# Altium footprint library Connectors Pad Lib.PcbLib: 211 footprints (part 1 of 14)
Each footprint in its own frame and in the unit in brackets; x right, y up, seen from the top. Pads: shape width x height; smd on the part's side, far side on the other; paste and mask are expansions set on the pad; w line width, h text height; cw(c..) or ccw(c..) is an arc to the next point about the centre after c.
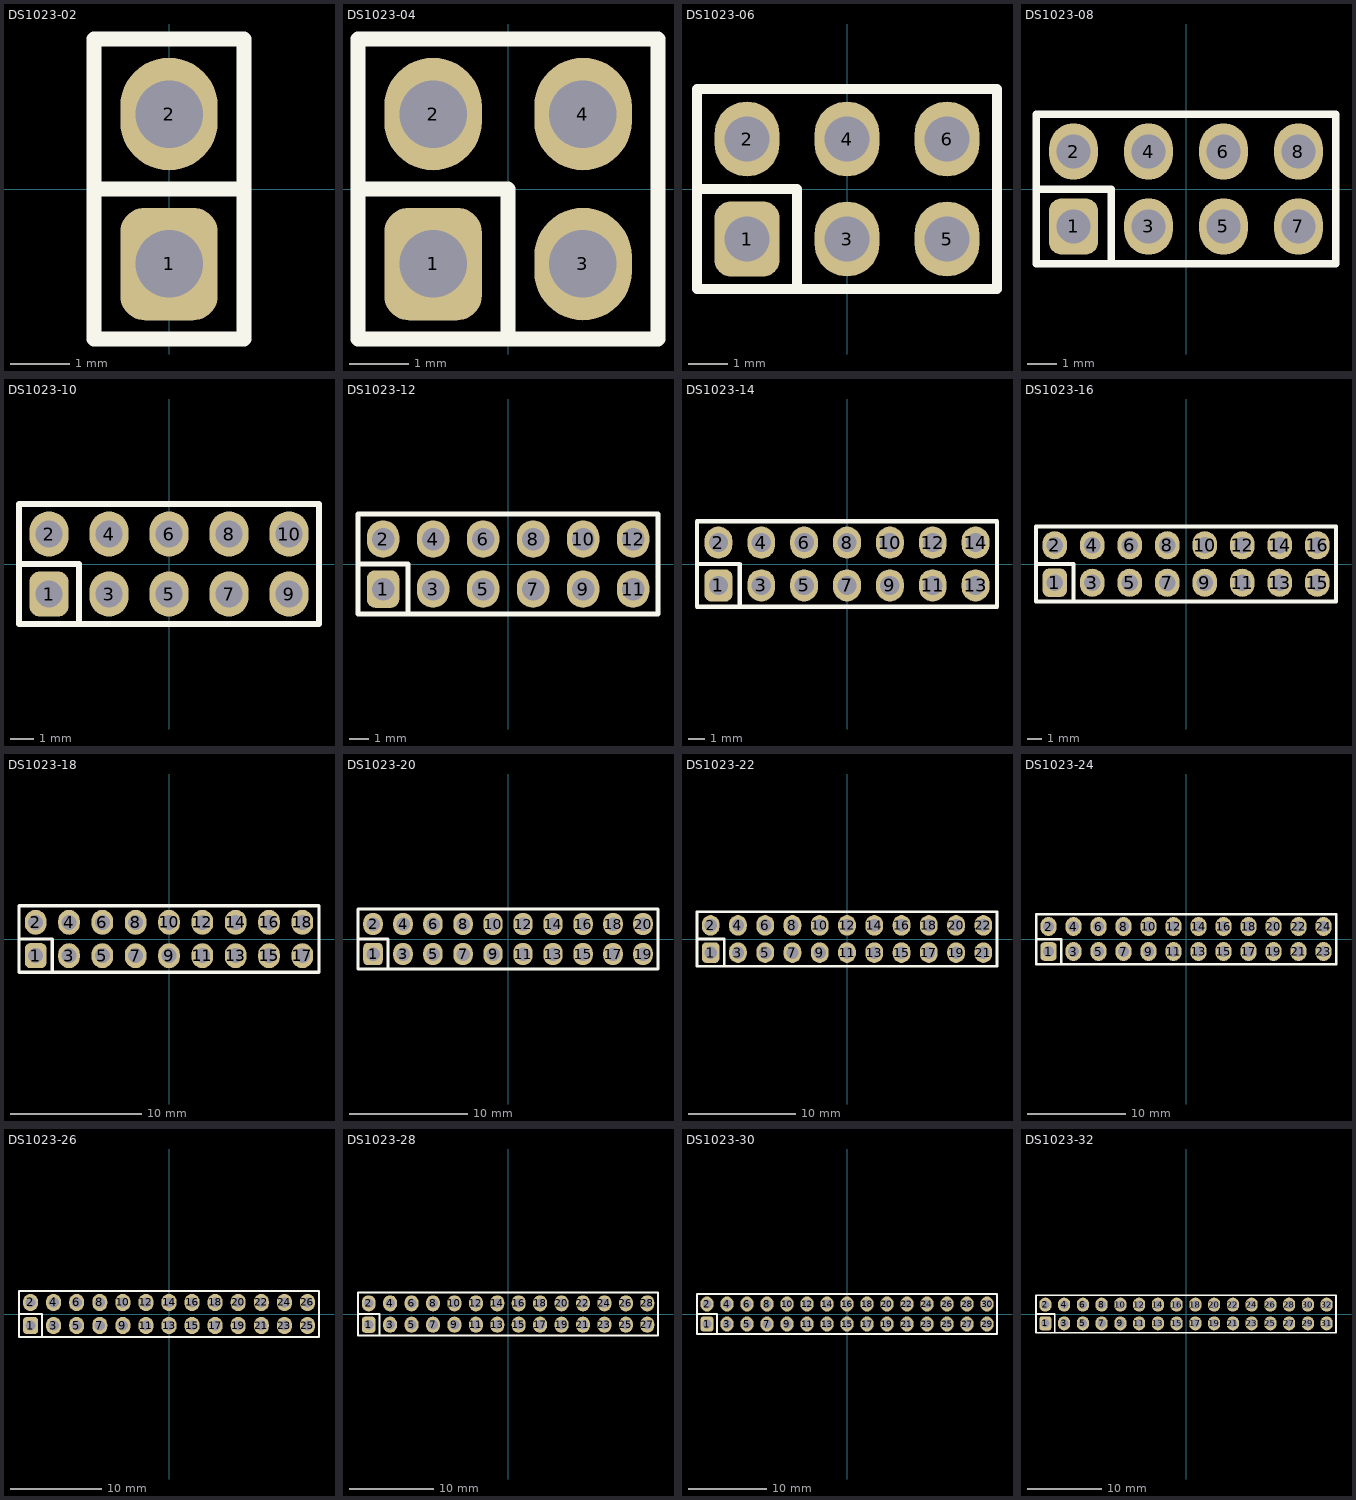
[diagram p0: the footprints below, top view; thin cyan lines are the x and y axes]

## DS1023-02 [mil]
pads (2):
  rrect50% 65x75 hole 45: 1(0,-50)
  oval 65x75 hole 45: 2(0,50)
Top Overlay:
  lines w10: -50,0 50,0 ; -50,-100 -50,100 50,100 50,-100 -50,-100
3D body "DS-1023-02.STEP": height 335.65, standoff -117.11, extent -50,-98.43 50,98.43

## DS1023-04 [mil]
pads (4):
  rrect50% 65x75 hole 45: 1(-50,-50)
  oval 65x75 hole 45: 2(-50,50) 3(50,-50) 4(50,50)
Top Overlay:
  lines w10: -100,0 0,0 0,-100 ; -100,-100 -100,100 100,100 100,-100 -100,-100
3D body "DS-1023-04.STEP": height 335.65, standoff -117.11, extent -100,-98.43 100,98.43

## DS1023-06 [mil]
pads (6):
  rrect50% 65x75 hole 45: 1(-100,-50)
  oval 65x75 hole 45: 2(-100,50) 3(0,-50) 4(0,50) 5(100,-50) 6(100,50)
Top Overlay:
  lines w10: -150,0 -50,0 -50,-100 ; -150,-100 150,-100 150,100 -150,100 -150,-100
3D body "DS-1023-06.STEP": height 335.65, standoff -117.11, extent -150,-98.43 150,98.43

## DS1023-08 [mil]
pads (8):
  rrect50% 65x75 hole 45: 1(-150,-50)
  oval 65x75 hole 45: 2(-150,50) 3(-50,-50) 4(-50,50) 5(50,-50) 6(50,50) 7(150,-50) 8(150,50)
Top Overlay:
  lines w10: -200,0 -100,0 -100,-100 ; -200,-100 200,-100 200,100 -200,100 -200,-100
3D body "DS-1023-08.STEP": height 335.65, standoff -117.11, extent -200,-98.43 200,98.43

## DS1023-10 [mil]
pads (10):
  rrect50% 65x75 hole 45: 1(-200,-50)
  oval 65x75 hole 45: 2(-200,50) 3(-100,-50) 4(-100,50) 5(0,-50) 6(0,50) 7(100,-50) 8(100,50) 9(200,-50) 10(200,50)
Top Overlay:
  lines w10: -250,0 -150,0 -150,-100 ; -250,-100 250,-100 250,100 -250,100 -250,-100
3D body "DS-1023-10.STEP": height 335.65, standoff -117.11, extent -250,-98.43 250,98.43

## DS1023-12 [mil]
pads (12):
  rrect50% 65x75 hole 45: 1(-250,-50)
  oval 65x75 hole 45: 2(-250,50) 3(-150,-50) 4(-150,50) 5(-50,-50) 6(-50,50) 7(50,-50) 8(50,50) 9(150,-50) 10(150,50) 11(250,-50) 12(250,50)
Top Overlay:
  lines w10: -300,0 -200,0 -200,-100 ; -300,-100 300,-100 300,100 -300,100 -300,-100
3D body "DS-1023-12.STEP": height 335.65, standoff -117.11, extent -300,-98.43 300,98.43

## DS1023-14 [mil]
pads (14):
  rrect50% 65x75 hole 45: 1(-300,-50)
  oval 65x75 hole 45: 2(-300,50) 3(-200,-50) 4(-200,50) 5(-100,-50) 6(-100,50) 7(0,-50) 8(0,50) 9(100,-50) 10(100,50) 11(200,-50) 12(200,50) 13(300,-50) 14(300,50)
Top Overlay:
  lines w10: -350,0 -250,0 -250,-100 ; -350,-100 350,-100 350,100 -350,100 -350,-100
3D body "DS-1023-14.STEP": height 335.65, standoff -117.11, extent -350,-98.43 350,98.43

## DS1023-16 [mil]
pads (16):
  rrect50% 65x75 hole 45: 1(-350,-50)
  oval 65x75 hole 45: 2(-350,50) 3(-250,-50) 4(-250,50) 5(-150,-50) 6(-150,50) 7(-50,-50) 8(-50,50) 9(50,-50) 10(50,50) 11(150,-50) 12(150,50) 13(250,-50) 14(250,50) 15(350,-50) 16(350,50)
Top Overlay:
  lines w10: -400,0 -300,0 -300,-100 ; -400,-100 400,-100 400,100 -400,100 -400,-100
3D body "DS-1023-16.STEP": height 335.65, standoff -117.11, extent -400,-98.43 400,98.43

## DS1023-18 [mil]
pads (18):
  rrect50% 65x75 hole 45: 1(-400,-50)
  oval 65x75 hole 45: 2(-400,50) 3(-300,-50) 4(-300,50) 5(-200,-50) 6(-200,50) 7(-100,-50) 8(-100,50) 9(0,-50) 10(0,50) 11(100,-50) 12(100,50) 13(200,-50) 14(200,50) 15(300,-50) 16(300,50) 17(400,-50) 18(400,50)
Top Overlay:
  lines w10: -450,0 -350,0 -350,-100 ; -450,-100 -450,100 450,100 450,-100 -450,-100
3D body "DS-1023-18.STEP": height 335.65, standoff -117.11, extent -450,-98.43 450,98.43

## DS1023-20 [mil]
pads (20):
  rrect50% 65x75 hole 45: 1(-450,-50)
  oval 65x75 hole 45: 2(-450,50) 3(-350,-50) 4(-350,50) 5(-250,-50) 6(-250,50) 7(-150,-50) 8(-150,50) 9(-50,-50) 10(-50,50) 11(50,-50) 12(50,50) 13(150,-50) 14(150,50) 15(250,-50) 16(250,50) 17(350,-50) 18(350,50) 19(450,-50) 20(450,50)
Top Overlay:
  lines w10: -500,0 -400,0 -400,-100 ; -500,-100 500,-100 500,100 -500,100 -500,-100
3D body "DS-1023-20.STEP": height 335.65, standoff -117.11, extent -500,-98.43 500,98.43

## DS1023-22 [mil]
pads (22):
  rrect50% 65x75 hole 45: 1(-500,-50)
  oval 65x75 hole 45: 2(-500,50) 3(-400,-50) 4(-400,50) 5(-300,-50) 6(-300,50) 7(-200,-50) 8(-200,50) 9(-100,-50) 10(-100,50) 11(0,-50) 12(0,50) 13(100,-50) 14(100,50) 15(200,-50) 16(200,50) 17(300,-50) 18(300,50) 19(400,-50) 20(400,50) 21(500,-50) 22(500,50)
Top Overlay:
  lines w10: -550,0 -450,0 -450,-100 ; -550,-100 -550,100 550,100 550,-100 -550,-100
3D body "DS-1023-22.STEP": height 335.65, standoff -117.11, extent -550,-98.43 550,98.43

## DS1023-24 [mil]
pads (24):
  rrect50% 65x75 hole 45: 1(-550,-50)
  oval 65x75 hole 45: 2(-550,50) 3(-450,-50) 4(-450,50) 5(-350,-50) 6(-350,50) 7(-250,-50) 8(-250,50) 9(-150,-50) 10(-150,50) 11(-50,-50) 12(-50,50) 13(50,-50) 14(50,50) 15(150,-50) 16(150,50) 17(250,-50) 18(250,50) 19(350,-50) 20(350,50) 21(450,-50) 22(450,50) 23(550,-50) 24(550,50)
Top Overlay:
  lines w10: -600,0 -500,0 -500,-100 ; -600,-100 600,-100 600,100 -600,100 -600,-100
3D body "DS-1023-24.STEP": height 335.65, standoff -117.11, extent -600,-98.43 600,98.43

## DS1023-26 [mil]
pads (26):
  rrect50% 65x75 hole 45: 1(-600,-50)
  oval 65x75 hole 45: 2(-600,50) 3(-500,-50) 4(-500,50) 5(-400,-50) 6(-400,50) 7(-300,-50) 8(-300,50) 9(-200,-50) 10(-200,50) 11(-100,-50) 12(-100,50) 13(0,-50) 14(0,50) 15(100,-50) 16(100,50) 17(200,-50) 18(200,50) 19(300,-50) 20(300,50) 21(400,-50) 22(400,50) 23(500,-50) 24(500,50) 25(600,-50) 26(600,50)
Top Overlay:
  lines w10: -650,0 -550,0 -550,-100 ; -650,-100 -650,100 650,100 650,-100 -650,-100
3D body "DS-1023-26.STEP": height 335.65, standoff -117.11, extent -650,-98.43 650,98.43

## DS1023-28 [mil]
pads (28):
  rrect50% 65x75 hole 45: 1(-650,-50)
  oval 65x75 hole 45: 2(-650,50) 3(-550,-50) 4(-550,50) 5(-450,-50) 6(-450,50) 7(-350,-50) 8(-350,50) 9(-250,-50) 10(-250,50) 11(-150,-50) 12(-150,50) 13(-50,-50) 14(-50,50) 15(50,-50) 16(50,50) 17(150,-50) 18(150,50) 19(250,-50) 20(250,50) 21(350,-50) 22(350,50) 23(450,-50) 24(450,50) 25(550,-50) 26(550,50) 27(650,-50) 28(650,50)
Top Overlay:
  lines w10: -700,0 -600,0 -600,-100 ; -700,-100 700,-100 700,100 -700,100 -700,-100
3D body "DS-1023-28.STEP": height 335.65, standoff -117.11, extent -700,-98.43 700,98.43

## DS1023-30 [mil]
pads (30):
  rrect50% 65x75 hole 45: 1(-700,-50)
  oval 65x75 hole 45: 2(-700,50) 3(-600,-50) 4(-600,50) 5(-500,-50) 6(-500,50) 7(-400,-50) 8(-400,50) 9(-300,-50) 10(-300,50) 11(-200,-50) 12(-200,50) 13(-100,-50) 14(-100,50) 15(0,-50) 16(0,50) 17(100,-50) 18(100,50) 19(200,-50) 20(200,50) 21(300,-50) 22(300,50) 23(400,-50) 24(400,50) 25(500,-50) 26(500,50) 27(600,-50) 28(600,50) 29(700,-50) 30(700,50)
Top Overlay:
  lines w10: -750,0 -650,0 -650,-100 ; -750,-100 750,-100 750,100 -750,100 -750,-100
3D body "DS-1023-30.STEP": height 335.65, standoff -117.11, extent -750,-98.43 750,98.43

## DS1023-32 [mil]
pads (32):
  rrect50% 65x75 hole 45: 1(-750,-50)
  oval 65x75 hole 45: 2(-750,50) 3(-650,-50) 4(-650,50) 5(-550,-50) 6(-550,50) 7(-450,-50) 8(-450,50) 9(-350,-50) 10(-350,50) 11(-250,-50) 12(-250,50) 13(-150,-50) 14(-150,50) 15(-50,-50) 16(-50,50) 17(50,-50) 18(50,50) 19(150,-50) 20(150,50) 21(250,-50) 22(250,50) 23(350,-50) 24(350,50) 25(450,-50) 26(450,50) 27(550,-50) 28(550,50) 29(650,-50) 30(650,50) 31(750,-50) 32(750,50)
Top Overlay:
  lines w10: -800,0 -700,0 -700,-100 ; -800,-100 800,-100 800,100 -800,100 -800,-100
3D body "DS-1023-32.STEP": height 335.65, standoff -117.11, extent -800,-98.43 800,98.43